# Altium footprint library ST封装.PcbLib: 1336 footprints (part 75 of 109)
Each footprint in its own frame and in the unit in brackets; x right, y up, seen from the top. Pads: shape width x height; smd on the part's side, far side on the other; paste and mask are expansions set on the pad; w line width, h text height; cw(c..) or ccw(c..) is an arc to the next point about the centre after c.
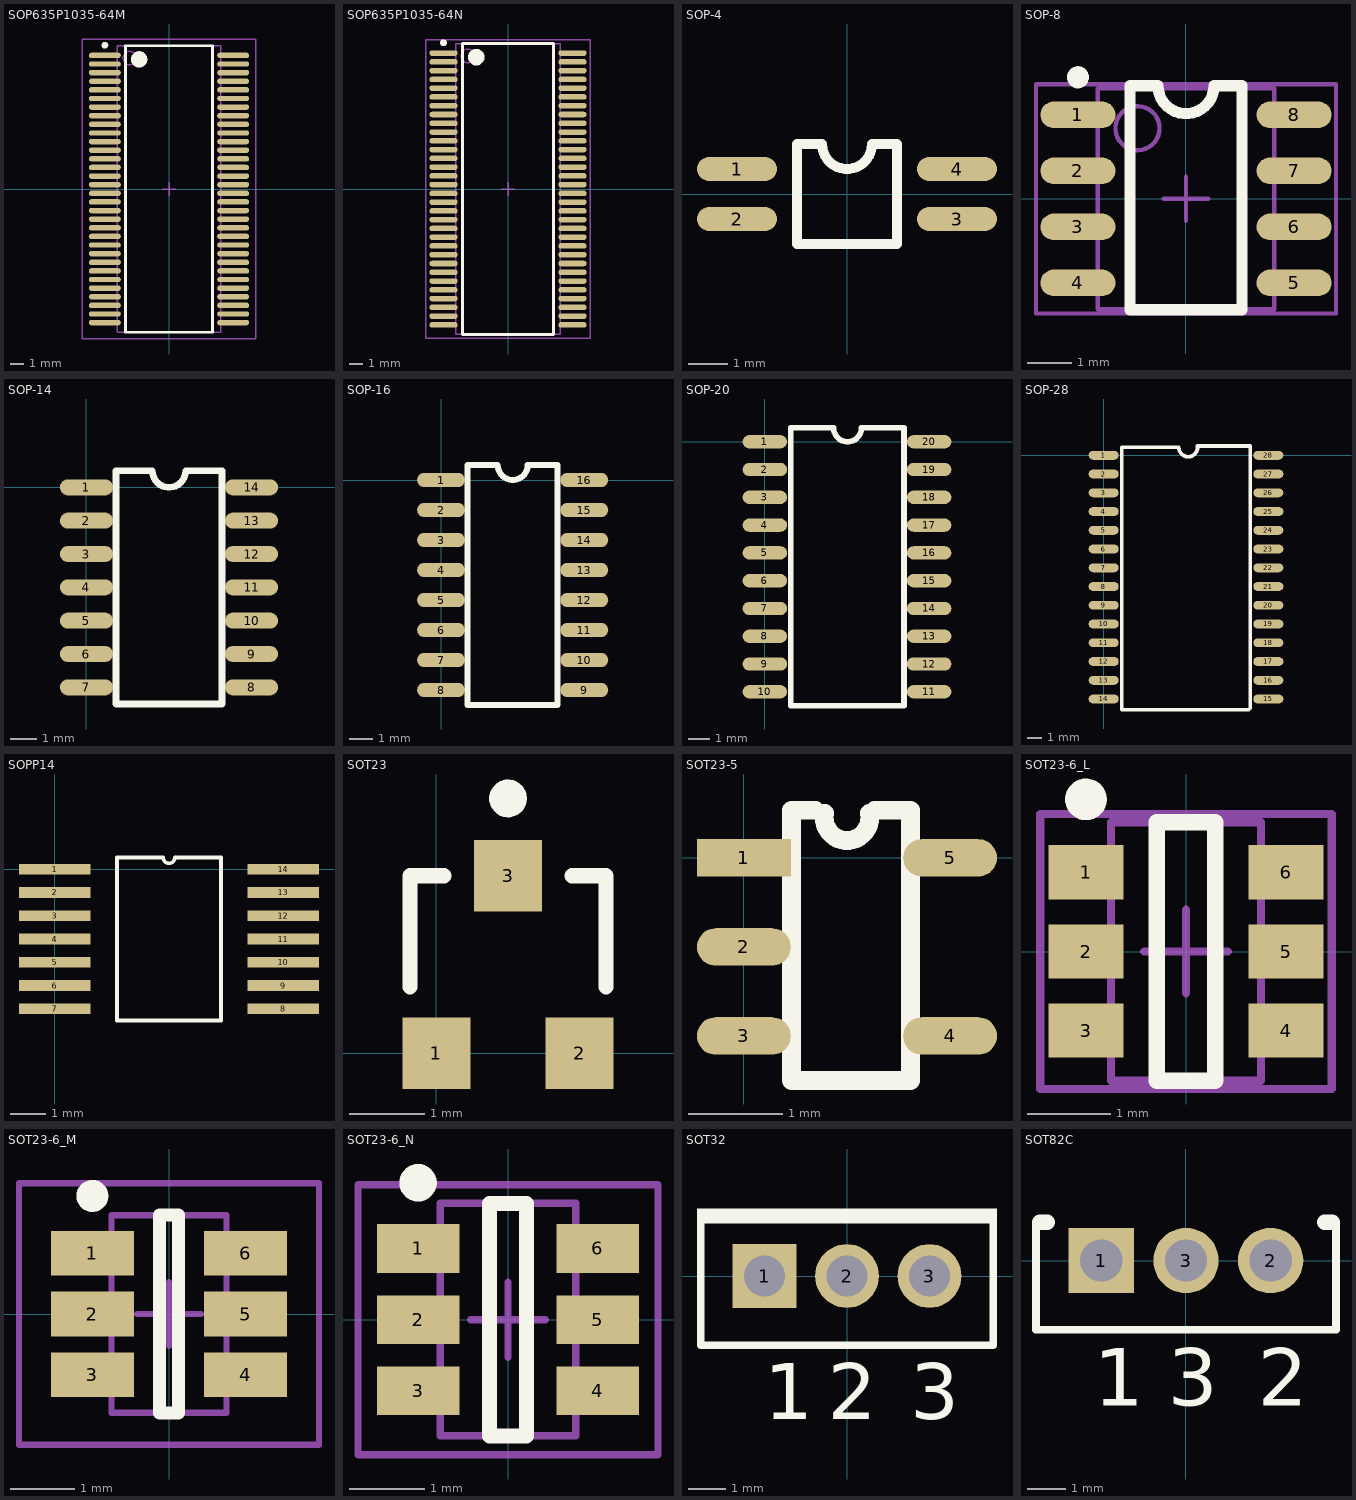
[diagram p74: the footprints below, top view; thin cyan lines are the x and y axes]

## SOP635P1035-64M [mm] "SOP, 64-Leads, Body 21x7.5mm, Pitch 0.635mm, IPC Low Density"
height 2.8
pads (64):
  oval 2.35x0.4 smd: 1(-4.725,9.842) 2(-4.725,9.207) 3(-4.725,8.572) 4(-4.725,7.938) 5(-4.725,7.302) 6(-4.725,6.667) 7(-4.725,6.032) 8(-4.725,5.397) 9(-4.725,4.763) 10(-4.725,4.127) 11(-4.725,3.492) 12(-4.725,2.857) 13(-4.725,2.222) 14(-4.725,1.587) 15(-4.725,0.953) 16(-4.725,0.318) 17(-4.725,-0.318) 18(-4.725,-0.953) 19(-4.725,-1.587) 20(-4.725,-2.222) 21(-4.725,-2.857) 22(-4.725,-3.492) 23(-4.725,-4.127) 24(-4.725,-4.763) 25(-4.725,-5.397) 26(-4.725,-6.032) 27(-4.725,-6.667) 28(-4.725,-7.302) 29(-4.725,-7.938) 30(-4.725,-8.572) 31(-4.725,-9.207) 32(-4.725,-9.842) 33(4.725,-9.842) 34(4.725,-9.207) 35(4.725,-8.572) 36(4.725,-7.938) 37(4.725,-7.302) 38(4.725,-6.667) 39(4.725,-6.032) 40(4.725,-5.397) 41(4.725,-4.763) 42(4.725,-4.127) 43(4.725,-3.492) 44(4.725,-2.857) 45(4.725,-2.222) 46(4.725,-1.587) 47(4.725,-0.953) 48(4.725,-0.318) 49(4.725,0.318) 50(4.725,0.953) 51(4.725,1.587) 52(4.725,2.222) 53(4.725,2.857) 54(4.725,3.492) 55(4.725,4.127) 56(4.725,4.763) 57(4.725,5.397) 58(4.725,6.032) 59(4.725,6.667) 60(4.725,7.302) 61(4.725,7.938) 62(4.725,8.572) 63(4.725,9.207) 64(4.725,9.842)
Top Overlay:
  circle w0.25: c-4.725,10.593 r0.125
  circle w0.6: c-2.2,9.55 r0.3
  lines w0.2: -3.2,-10.55 -3.2,10.55 3.2,10.55 3.2,-10.55 -3.2,-10.55
Mechanical 13:
  circle w0.1: c-2.895,9.64 r0.5
  lines w0.1: -3.795,-10.54 -3.795,10.54 3.795,10.54 3.795,-10.54 -3.795,-10.54
Mechanical 15:
  lines w0.1: -0.5,0 0.5,0 ; 0,-0.5 0,0.5 ; -6.4,-11.05 -6.4,11.05 6.4,11.05 6.4,-11.05 -6.4,-11.05
3D body: height 2.8, standoff 0, extent -3.795,-10.54 3.795,10.54

## SOP635P1035-64N [mm] "SOP, 64-Leads, Body 21x7.5mm, Pitch 0.635mm, IPC Medium Density"
height 2.8
pads (64):
  oval 2.05x0.4 smd: 1(-4.675,9.842) 2(-4.675,9.207) 3(-4.675,8.572) 4(-4.675,7.938) 5(-4.675,7.302) 6(-4.675,6.667) 7(-4.675,6.032) 8(-4.675,5.397) 9(-4.675,4.763) 10(-4.675,4.127) 11(-4.675,3.492) 12(-4.675,2.857) 13(-4.675,2.222) 14(-4.675,1.587) 15(-4.675,0.953) 16(-4.675,0.318) 17(-4.675,-0.318) 18(-4.675,-0.953) 19(-4.675,-1.587) 20(-4.675,-2.222) 21(-4.675,-2.857) 22(-4.675,-3.492) 23(-4.675,-4.127) 24(-4.675,-4.763) 25(-4.675,-5.397) 26(-4.675,-6.032) 27(-4.675,-6.667) 28(-4.675,-7.302) 29(-4.675,-7.938) 30(-4.675,-8.572) 31(-4.675,-9.207) 32(-4.675,-9.842) 33(4.675,-9.842) 34(4.675,-9.207) 35(4.675,-8.572) 36(4.675,-7.938) 37(4.675,-7.302) 38(4.675,-6.667) 39(4.675,-6.032) 40(4.675,-5.397) 41(4.675,-4.763) 42(4.675,-4.127) 43(4.675,-3.492) 44(4.675,-2.857) 45(4.675,-2.222) 46(4.675,-1.587) 47(4.675,-0.953) 48(4.675,-0.318) 49(4.675,0.318) 50(4.675,0.953) 51(4.675,1.587) 52(4.675,2.222) 53(4.675,2.857) 54(4.675,3.492) 55(4.675,4.127) 56(4.675,4.763) 57(4.675,5.397) 58(4.675,6.032) 59(4.675,6.667) 60(4.675,7.302) 61(4.675,7.938) 62(4.675,8.572) 63(4.675,9.207) 64(4.675,9.842)
Top Overlay:
  circle w0.6: c-2.3,9.55 r0.3
  circle w0.25: c-4.675,10.593 r0.125
  lines w0.2: -3.3,-10.55 3.3,-10.55 3.3,10.55 -3.3,10.55 -3.3,-10.55
Mechanical 13:
  circle w0.1: c-2.895,9.64 r0.5
  lines w0.1: -3.795,-10.54 3.795,-10.54 3.795,10.54 -3.795,10.54 -3.795,-10.54
Mechanical 15:
  lines w0.1: -0.5,0 0.5,0 ; 0,-0.5 0,0.5 ; -5.95,-10.8 5.95,-10.8 5.95,10.8 -5.95,10.8 -5.95,-10.8
3D body: height 2.8, standoff 0, extent -3.795,-10.54 3.795,10.54

## SOP-4 [mil]
height 39.37
pads (4):
  oval 80x24 smd: 1(-110,25) 2(-110,-25) 3(110,-25) 4(110,25)
Top Overlay:
  lines w10: -50,-50 50,-50 50,50 25,50 cw(c0,50) -25,50 -50,50 -50,-50
3D body "User Library-SOP-4-1.step": height 82.68, standoff 0, extent -137.8,-55.12 137.79,55.12

## SOP-8 [mm]
height 1
pads (8):
  oval 1.7x0.6 smd: 1(-2.45,1.905) 2(-2.45,0.635) 3(-2.45,-0.635) 4(-2.45,-1.905) 5(2.45,-1.905) 6(2.45,-0.635) 7(2.45,0.635) 8(2.45,1.905)
Top Overlay:
  circle w0.25: c-2.45,2.755 r0.125
  lines w0.254: -1.27,-2.515 1.27,-2.515 1.27,2.565 0.635,2.565 cw(c0,2.565) -0.635,2.565 -1.27,2.565 -1.27,-2.515
Mechanical 13:
  circle w0.1: c-1.1,1.6 r0.5
  lines w0.1: -2,-2.5 -2,2.5 2,2.5 2,-2.5 -2,-2.5
Mechanical 15:
  lines w0.1: -0.5,0 0.5,0 ; 0,-0.5 0,0.5 ; -3.4,-2.6 -3.4,2.6 3.4,2.6 3.4,-2.6 -3.4,-2.6
3D body "SO-8.STEP": height 1.7, standoff 0, extent -3,-2.45 3,2.45

## SOP-14 [mil]
pads (14):
  oval 80x24 smd: 1(0,0) 2(0,-50) 3(0,-100) 4(0,-150) 5(0,-200) 6(0,-250) 7(0,-300) 8(247.56,-300) 9(247.56,-250) 10(247.56,-200) 11(247.56,-150) 12(247.56,-100) 13(247.56,-50) 14(247.56,0)
Top Overlay:
  lines w10: 44.25,-325 203.31,-325 203.31,25 148.78,25 cw(c123.78,25) 98.78,25 44.25,25 44.25,-325
3D body "SOP14.STEP": height 63.39, standoff 0, extent 2.95,-321.27 247.04,21.25

## SOP-16 [mil]
pads (16):
  oval 80x24 smd: 1(0,0) 2(0,-50) 3(0,-100) 4(0,-150) 5(0,-200) 6(0,-250) 7(0,-300) 8(0,-350) 9(238.5,-350) 10(238.5,-300) 11(238.5,-250) 12(238.5,-200) 13(238.5,-150) 14(238.5,-100) 15(238.5,-50) 16(238.5,0)
Top Overlay:
  lines w10: 44.25,-375 194.25,-375 194.25,25 144.25,25 cw(c119.25,25) 94.25,25 44.25,25 44.25,-375
3D body "SOP-16.STEP": height 59.06, standoff -3.94, extent -3.32,-371.84 243.33,21.86

## SOP-20 [mil]
pads (20):
  oval 80x24 smd: 1(0,0) 2(0,-50) 3(0,-100) 4(0,-150) 5(0,-200) 6(0,-250) 7(0,-300) 8(0,-350) 9(0,-400) 10(0,-450) 11(295.59,-450) 12(295.59,-400) 13(295.59,-350) 14(295.59,-300) 15(295.59,-250) 16(295.59,-200) 17(295.59,-150) 18(295.59,-100) 19(295.59,-50) 20(295.59,0)
Top Overlay:
  lines w10: 46.22,-475 250.35,-475 250.35,25 173.78,25 cw(c148.78,25) 123.78,25 46.22,25 46.22,-475
3D body "SOP-20.STEP": height 98.43, standoff 0, extent -56.69,-475.98 356.7,25.99

## SOP-28 [mil]
pads (28):
  oval 80x24 smd: 1(0,0) 2(0,-50) 3(0,-100) 4(0,-150) 5(0,-200) 6(0,-250) 7(0,-300) 8(0,-350) 9(0,-400) 10(0,-450) 11(0,-500) 12(0,-550) 13(0,-600) 14(0,-650) 15(439.29,-650) 16(439.29,-600) 17(439.29,-550) 18(439.29,-500) 19(439.29,-450) 20(439.29,-400) 21(439.29,-350) 22(439.29,-300) 23(439.29,-250) 24(439.29,-200) 25(439.29,-150) 26(439.29,-100) 27(439.29,-50) 28(439.29,0)
Top Overlay:
  lines w10: 196.61,21.06 48.19,21.06 48.19,-678.94 387.17,-678.94 ; 200.55,21.06 ccw(c225.55,21.06) 250.55,21.06 ; 250.55,25 391.1,25 391.1,-675
3D body "SOP-28.STEP": height 98.43, standoff 0, extent 19.29,-679.34 430.71,29.32

## SOPP14 [mm]
pads (14):
  rect 2x0.3 smd: 1(0,0) 2(0,-0.65) 3(0,-1.3) 4(0,-1.95) 5(0,-2.6) 6(0,-3.25) 7(0,-3.9) 8(6.375,-3.9) 9(6.375,-3.25) 10(6.375,-2.6) 11(6.375,-1.95) 12(6.375,-1.3) 13(6.375,-0.65) 14(6.375,0)
Top Overlay:
  lines w0.1: 1.735,-4.225 4.64,-4.225 4.64,0.325 3.35,0.325 cw(c3.188,0.325) 3.025,0.325 1.735,0.325 1.735,-4.225

## SOT23 [mm]
pads (3):
  rect 0.9x0.95 smd: 1(0,0) 2(1.9,0) 3(0.95,2.35)
Top Overlay:
  circle w0.25: c0.95,3.375 r0.125
  lines w0.2: -0.35,0.875 -0.35,2.35 0.1,2.35 ; 1.8,2.35 2.25,2.35 2.25,0.875

## SOT23-5 [mm]
pads (5):
  rect 1x0.4 smd: 1(0,0)
  oval 1x0.4 smd: 2(0,-0.95) 3(0,-1.9) 4(2.2,-1.9) 5(2.2,0)
Top Overlay:
  lines w0.2: 0.762,0.508 0.508,0.508 0.508,-2.375 1.778,-2.375 1.778,0.508 1.397,0.508 ; 0.862,0.475 ccw(c1.1,0.427) 1.338,0.475
3D body "SOT-23-5.STEP": height 1.2, standoff 0, extent -0.257,-2.339 2.543,0.561

## SOT23-6_L [mm] "SOT23, 6-Leads, Body 2.9x1.6mm, Pitch 0.95mm, Lead Span 2.7mm, IPC High Density"
height 1.45
pads (6):
  rect 0.9x0.65 smd: 1(-1.2,0.95) 2(-1.2,0) 3(-1.2,-0.95) 4(1.2,-0.95) 5(1.2,0) 6(1.2,0.95)
Top Overlay:
  circle w0.25: c-1.2,1.825 r0.125
  lines w0.2: -0.35,-1.55 0.35,-1.55 0.35,1.55 -0.35,1.55 -0.35,-1.55
Mechanical 13:
  lines w0.1: -0.9,-1.55 -0.9,1.55 0.9,1.55 0.9,-1.55 -0.9,-1.55
Mechanical 15:
  lines w0.1: -0.5,0 0.5,0 ; 0,-0.5 0,0.5 ; -1.75,-1.65 -1.75,1.65 1.75,1.65 1.75,-1.65 -1.75,-1.65
3D body "User Library-SOT-23-6-3.STEP": height 0.86, standoff 0, extent -1.405,-1.5 1.405,1.5

## SOT23-6_M [mm] "SOT23, 6-Leads, Body 2.9x1.6mm, Pitch 0.95mm, Lead Span 2.7mm, IPC Low Density"
height 1.45
pads (6):
  rect 1.3x0.7 smd: 1(-1.2,0.95) 2(-1.2,0) 3(-1.2,-0.95) 4(1.2,-0.95) 5(1.2,0) 6(1.2,0.95)
Top Overlay:
  circle w0.25: c-1.2,1.85 r0.125
  lines w0.2: -0.15,-1.55 -0.15,1.55 0.15,1.55 0.15,-1.55 -0.15,-1.55
Mechanical 13:
  lines w0.1: -0.9,-1.55 0.9,-1.55 0.9,1.55 -0.9,1.55 -0.9,-1.55
Mechanical 15:
  lines w0.1: -0.5,0 0.5,0 ; 0,-0.5 0,0.5 ; -2.35,-2.05 2.35,-2.05 2.35,2.05 -2.35,2.05 -2.35,-2.05
3D body "User Library-SOT-23-6-3.STEP": height 0.86, standoff 0, extent -1.278,-1.5 1.532,1.5

## SOT23-6_N [mm] "SOT23, 6-Leads, Body 2.9x1.6mm, Pitch 0.95mm, Lead Span 2.7mm, IPC Medium Density"
height 1.45
pads (6):
  rect 1.1x0.65 smd: 1(-1.2,0.95) 2(-1.2,0) 3(-1.2,-0.95) 4(1.2,-0.95) 5(1.2,0) 6(1.2,0.95)
Top Overlay:
  circle w0.25: c-1.2,1.825 r0.125
  lines w0.2: -0.25,-1.55 -0.25,1.55 0.25,1.55 0.25,-1.55 -0.25,-1.55
Mechanical 13:
  lines w0.1: -0.9,-1.55 0.9,-1.55 0.9,1.55 -0.9,1.55 -0.9,-1.55
Mechanical 15:
  lines w0.1: -0.5,0 0.5,0 ; 0,-0.5 0,0.5 ; -2,-1.8 2,-1.8 2,1.8 -2,1.8 -2,-1.8

## SOT32 [mm] "SIP with Mounting Hole; 3 Leads; Body 10.7 x 7.6 x 2.6 mm (typ); Pitch 2.2 mm"
height 13.4
pads (3):
  rect 1.7x1.7 hole 1.1: 1(-2.2,0)
  round 1.7 hole 1.1: 2(0,0) 3(2.2,0)
Top Overlay:
  rectangle: -4,1.4 4,1.8
  lines w0.2: -3.9,1.4 -3.9,-1.85 3.9,-1.85 3.9,1.4
  text "3" at 1.692,-3.825 h1.5
  text "2" at -0.508,-3.825 h1.5
  text "1" at -2.2,-3.825 h1.5

## SOT82C [mm] "SIP; 3 Leads; Body 10.9 x 7.6 x 2.6 mm (typ); Pitch 2.2 mm"
height 11.3
pads (3):
  rect 1.7x1.7 hole 1.1: 1(-2.2,0)
  round 1.7 hole 1.1: 2(2.2,0) 3(0,0)
Top Overlay:
  lines w0.2: -3.9,1 -3.9,-1.8 3.9,-1.8 3.9,1
  lines w0.4: -3.8,1 -3.6,1 ; 3.6,1 3.8,1
  text "3" at -0.47,-3.78 h1.5
  text "1" at -2.4,-3.78 h1.5
  text "2" at 1.86,-3.78 h1.5